# Altium footprint library my Library.PcbLib: 1247 footprints (part 73 of 78)
Each footprint in its own frame and in the unit in brackets; x right, y up, seen from the top. Pads: shape width x height; smd on the part's side, far side on the other; paste and mask are expansions set on the pad; w line width, h text height; cw(c..) or ccw(c..) is an arc to the next point about the centre after c.
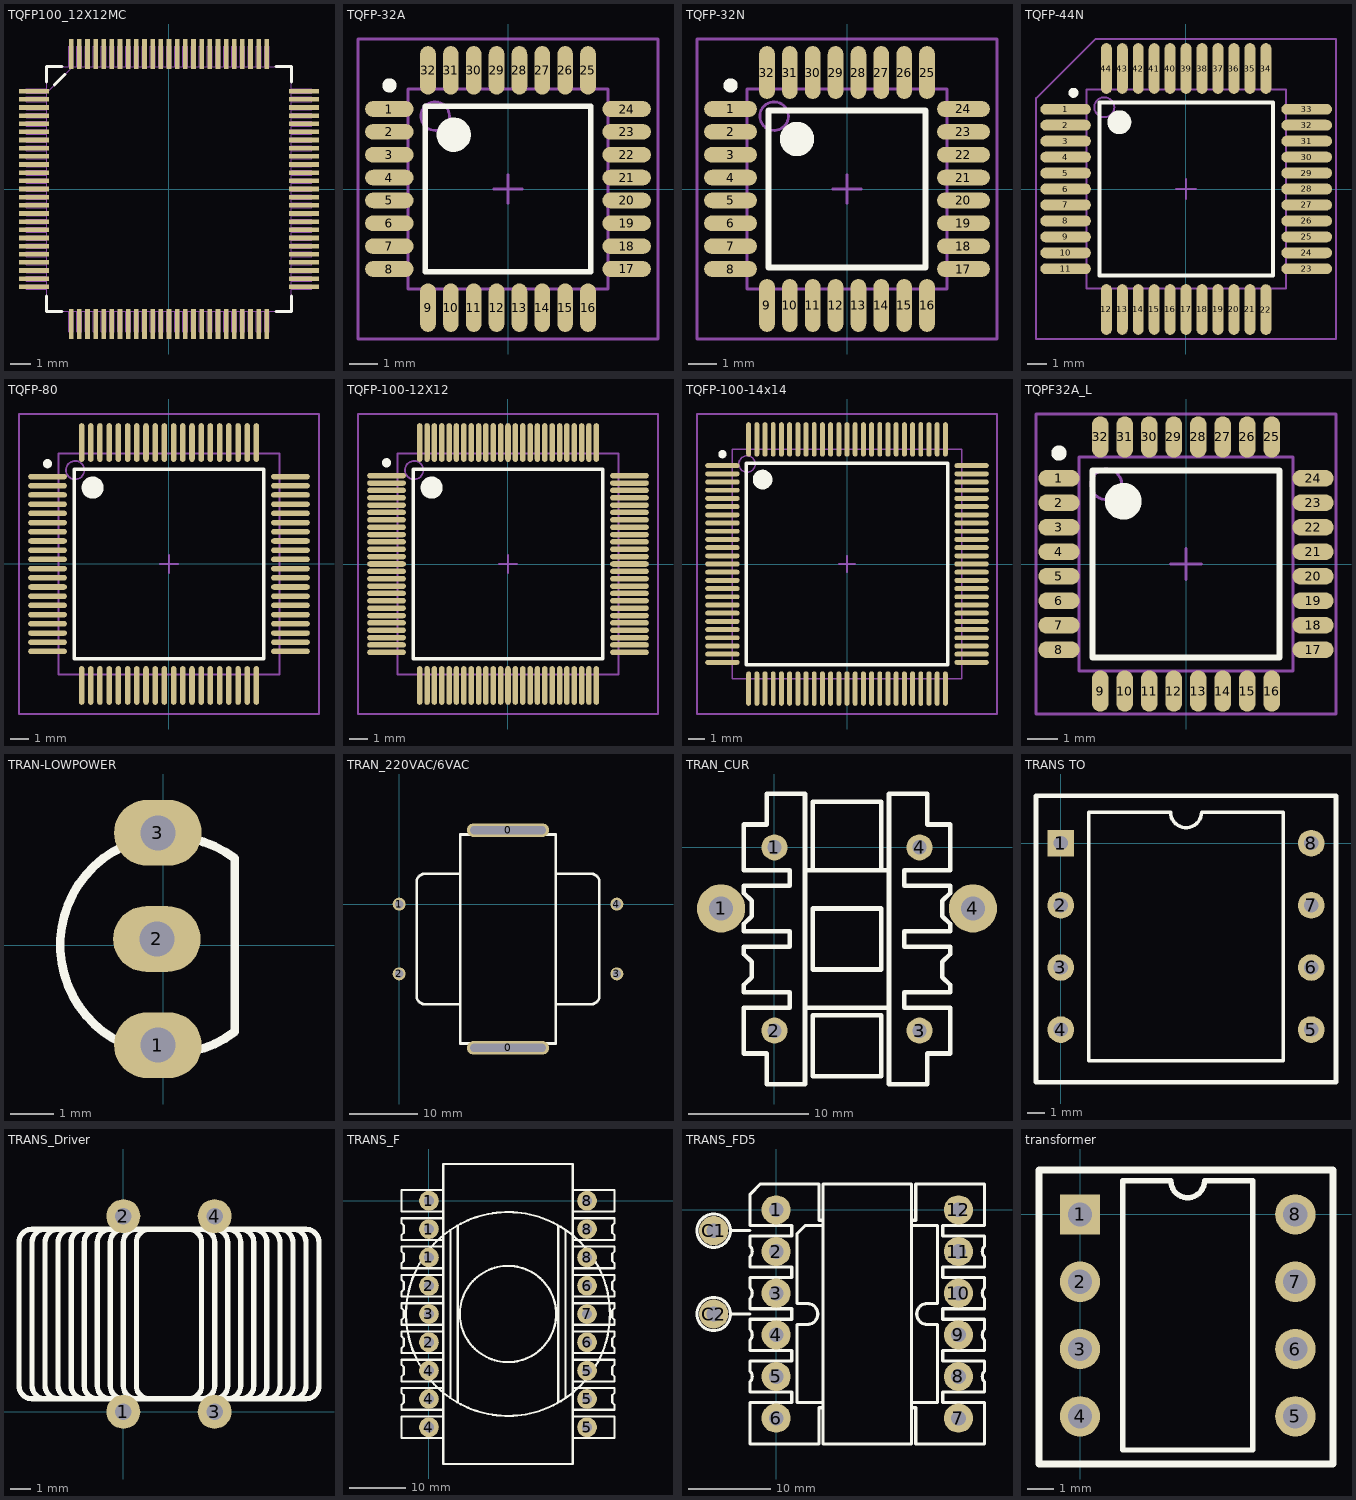
[diagram p72: the footprints below, top view; thin cyan lines are the x and y axes]

## TQFP100_12X12MC [mil]
pads (100):
  rect 58x9 smd: 1(-260.59,188.98) 2(-260.59,173.23) 3(-260.59,157.48) 4(-260.59,141.73) 5(-260.59,125.98) 6(-260.59,110.24) 7(-260.59,94.49) 8(-260.59,78.74) 9(-260.59,62.99) 10(-260.59,47.24) 11(-260.59,31.5) 12(-260.59,15.75) 13(-260.59,0) 14(-260.59,-15.75) 15(-260.59,-31.5) 16(-260.59,-47.24) 17(-260.59,-62.99) 18(-260.59,-78.74) 19(-260.59,-94.49) 20(-260.59,-110.24) 21(-260.59,-125.98) 22(-260.59,-141.73) 23(-260.59,-157.48) 24(-260.59,-173.23) 25(-260.59,-188.98) 51(260.59,-188.98) 52(260.59,-173.23) 53(260.59,-157.48) 54(260.59,-141.73) 55(260.59,-125.98) 56(260.59,-110.24) 57(260.59,-94.49) 58(260.59,-78.74) 59(260.59,-62.99) 60(260.59,-47.24) 61(260.59,-31.5) 62(260.59,-15.75) 63(260.59,0) 64(260.59,15.75) 65(260.59,31.5) 66(260.59,47.24) 67(260.59,62.99) 68(260.59,78.74) 69(260.59,94.49) 70(260.59,110.24) 71(260.59,125.98) 72(260.59,141.73) 73(260.59,157.48) 74(260.59,173.23) 75(260.59,188.98)
  rect 9x58 smd: 26(-188.98,-260.59) 27(-173.23,-260.59) 28(-157.48,-260.59) 29(-141.73,-260.59) 30(-125.98,-260.59) 31(-110.24,-260.59) 32(-94.49,-260.59) 33(-78.74,-260.59) 34(-62.99,-260.59) 35(-47.24,-260.59) 36(-31.5,-260.59) 37(-15.75,-260.59) 38(0,-260.59) 39(15.75,-260.59) 40(31.5,-260.59) 41(47.24,-260.59) 42(62.99,-260.59) 43(78.74,-260.59) 44(94.49,-260.59) 45(110.24,-260.59) 46(125.98,-260.59) 47(141.73,-260.59) 48(157.48,-260.59) 49(173.23,-260.59) 50(188.98,-260.59) 76(188.98,260.59) 77(173.23,260.59) 78(157.48,260.59) 79(141.73,260.59) 80(125.98,260.59) 81(110.24,260.59) 82(94.49,260.59) 83(78.74,260.59) 84(62.99,260.59) 85(47.24,260.59) 86(31.5,260.59) 87(15.75,260.59) 88(0,260.59) 89(-15.75,260.59) 90(-31.5,260.59) 91(-47.24,260.59) 92(-62.99,260.59) 93(-78.74,260.59) 94(-94.49,260.59) 95(-110.24,260.59) 96(-125.98,260.59) 97(-141.73,260.59) 98(-157.48,260.59) 99(-173.23,260.59) 100(-188.98,260.59)
Top Overlay:
  lines w6: -236.22,-206.58 -236.22,-236.22 -206.58,-236.22 ; -236.22,206.58 -236.22,236.22 -206.58,236.22 ; -221.11,201.33 -201.33,221.11 ; 206.58,-236.22 236.22,-236.22 236.22,-206.58 ; 206.58,236.22 236.22,236.22 236.22,206.58
Mechanical 1:
  drawing of 405 lines, arcs and shapes, not listed
3D body "User Library-TQFP100-10x10x05.step": height 39.97, standoff 0.6, extent -275.81,-278.81 275.37,272.37

## TQFP-32A [mm] "TQFP, 32-Leads, Body 9.3x9.3mm (max), Pitch 0.80mm, IPC Medium Density"
height 1.2
pads (32):
  oval 1.7x0.55 smd: 1(-4.15,2.8) 2(-4.15,2) 3(-4.15,1.2) 4(-4.15,0.4) 5(-4.15,-0.4) 6(-4.15,-1.2) 7(-4.15,-2) 8(-4.15,-2.8) 17(4.15,-2.8) 18(4.15,-2) 19(4.15,-1.2) 20(4.15,-0.4) 21(4.15,0.4) 22(4.15,1.2) 23(4.15,2) 24(4.15,2.8)
  oval 0.55x1.7 smd: 9(-2.8,-4.15) 10(-2,-4.15) 11(-1.2,-4.15) 12(-0.4,-4.15) 13(0.4,-4.15) 14(1.2,-4.15) 15(2,-4.15) 16(2.8,-4.15) 25(2.8,4.15) 26(2,4.15) 27(1.2,4.15) 28(0.4,4.15) 29(-0.4,4.15) 30(-1.2,4.15) 31(-2,4.15) 32(-2.8,4.15)
Top Overlay:
  circle w0.6: c-1.9,1.9 r0.3
  circle w0.25: c-4.15,3.625 r0.125
  lines w0.2: -2.9,-2.9 2.9,-2.9 2.9,2.9 -2.9,2.9 -2.9,-2.9
Mechanical 13:
  circle w0.1: c-2.55,2.55 r0.5
  lines w0.1: -3.5,-3.5 3.5,-3.5 3.5,3.5 -3.5,3.5 -3.5,-3.5
Mechanical 15:
  lines w0.1: -0.5,0 0.5,0 ; 0,-0.5 0,0.5 ; -5.25,-5.25 5.25,-5.25 5.25,5.25 -5.25,5.25 -5.25,-5.25
3D body "SW3dPS-SW3dPS-atmega8 (tqfp32)_V2008.STEP": height 1.02, standoff -0.09, extent -4.79,-4.807 4.81,4.793

## TQFP-32N [mm] "TQFP, 32-Leads, Body 9.2x9.2mm (max), Pitch 0.80mm, IPC Medium Density"
height 1.6
pads (32):
  oval 1.85x0.55 smd: 1(-4.075,2.8) 2(-4.075,2) 3(-4.075,1.2) 4(-4.075,0.4) 5(-4.075,-0.4) 6(-4.075,-1.2) 7(-4.075,-2) 8(-4.075,-2.8) 17(4.075,-2.8) 18(4.075,-2) 19(4.075,-1.2) 20(4.075,-0.4) 21(4.075,0.4) 22(4.075,1.2) 23(4.075,2) 24(4.075,2.8)
  oval 0.55x1.85 smd: 9(-2.8,-4.075) 10(-2,-4.075) 11(-1.2,-4.075) 12(-0.4,-4.075) 13(0.4,-4.075) 14(1.2,-4.075) 15(2,-4.075) 16(2.8,-4.075) 25(2.8,4.075) 26(2,4.075) 27(1.2,4.075) 28(0.4,4.075) 29(-0.4,4.075) 30(-1.2,4.075) 31(-2,4.075) 32(-2.8,4.075)
Top Overlay:
  circle w0.6: c-1.75,1.75 r0.3
  circle w0.25: c-4.075,3.625 r0.125
  lines w0.2: -2.75,-2.75 2.75,-2.75 2.75,2.75 -2.75,2.75 -2.75,-2.75
Mechanical 13:
  circle w0.1: c-2.55,2.55 r0.5
  lines w0.1: -3.5,-3.5 3.5,-3.5 3.5,3.5 -3.5,3.5 -3.5,-3.5
Mechanical 15:
  lines w0.1: -0.5,0 0.5,0 ; 0,-0.5 0,0.5 ; -5.25,-5.25 5.25,-5.25 5.25,5.25 -5.25,5.25 -5.25,-5.25
3D body: height 1.6, standoff 0.1, extent -3.5,-3.5 3.5,3.5

## TQFP-44N [mm]
pads (44):
  oval 2.54x0.55 smd: 1(-6.04,4.001) 2(-6.04,3.201) 3(-6.04,2.401) 4(-6.04,1.601) 5(-6.04,0.801) 6(-6.04,0.001) 7(-6.04,-0.799) 8(-6.04,-1.599) 9(-6.04,-2.399) 10(-6.04,-3.199) 11(-6.04,-3.999) 23(6.051,-3.998) 24(6.051,-3.198) 25(6.051,-2.398) 26(6.051,-1.598) 27(6.051,-0.798) 28(6.051,0.002) 29(6.051,0.802) 30(6.051,1.602) 31(6.051,2.402) 32(6.051,3.202) 33(6.05,4.002)
  oval 0.55x2.54 smd: 12(-3.995,-6.042) 13(-3.195,-6.042) 14(-2.395,-6.042) 15(-1.595,-6.042) 16(-0.795,-6.042) 17(0.005,-6.042) 18(0.805,-6.042) 19(1.605,-6.042) 20(2.405,-6.042) 21(3.205,-6.042) 22(4.006,-6.044) 34(4.005,6.045) 35(3.205,6.045) 36(2.405,6.045) 37(1.605,6.045) 38(0.805,6.045) 39(0.005,6.045) 40(-0.795,6.045) 41(-1.595,6.045) 42(-2.395,6.045) 43(-3.195,6.045) 44(-3.995,6.045)
Top Overlay:
  circle w0.6: c-3.345,3.352 r0.3
  circle w0.25: c-5.645,4.827 r0.125
  lines w0.2: -4.345,-4.348 -4.345,4.352 4.355,4.352 4.355,-4.348 -4.345,-4.348
Mechanical 13:
  circle w0.1: c-4.095,4.102 r0.5
  lines w0.1: -4.995,-4.998 5.005,-4.998 5.005,5.002 -4.995,5.002 -4.995,-4.998
Mechanical 15:
  lines w0.1: -7.523,-7.517 7.524,-7.517 7.524,7.52 -4.552,7.52 -7.513,4.558 -7.513,-7.517 ; -0.495,0.002 0.505,0.002 ; 0.005,-0.498 0.005,0.502
3D body "User Library-TQFP44.STEP": height 1.02, standoff -0.05, extent -6.011,-6.005 5.989,5.995

## TQFP-80 [mm] "Thin QFP, 80-Leads, Body 12x12mm, Pitch 0.5mm, IPC Low Density"
height 1.2
pads (80):
  oval 2.1x0.3 smd: 1(-6.6,4.75) 2(-6.6,4.25) 3(-6.6,3.75) 4(-6.6,3.25) 5(-6.6,2.75) 6(-6.6,2.25) 7(-6.6,1.75) 8(-6.6,1.25) 9(-6.6,0.75) 10(-6.6,0.25) 11(-6.6,-0.25) 12(-6.6,-0.75) 13(-6.6,-1.25) 14(-6.6,-1.75) 15(-6.6,-2.25) 16(-6.6,-2.75) 17(-6.6,-3.25) 18(-6.6,-3.75) 19(-6.6,-4.25) 20(-6.6,-4.75) 41(6.6,-4.75) 42(6.6,-4.25) 43(6.6,-3.75) 44(6.6,-3.25) 45(6.6,-2.75) 46(6.6,-2.25) 47(6.6,-1.75) 48(6.6,-1.25) 49(6.6,-0.75) 50(6.6,-0.25) 51(6.6,0.25) 52(6.6,0.75) 53(6.6,1.25) 54(6.6,1.75) 55(6.6,2.25) 56(6.6,2.75) 57(6.6,3.25) 58(6.6,3.75) 59(6.6,4.25) 60(6.6,4.75)
  oval 0.3x2.1 smd: 21(-4.75,-6.6) 22(-4.25,-6.6) 23(-3.75,-6.6) 24(-3.25,-6.6) 25(-2.75,-6.6) 26(-2.25,-6.6) 27(-1.75,-6.6) 28(-1.25,-6.6) 29(-0.75,-6.6) 30(-0.25,-6.6) 31(0.25,-6.6) 32(0.75,-6.6) 33(1.25,-6.6) 34(1.75,-6.6) 35(2.25,-6.6) 36(2.75,-6.6) 37(3.25,-6.6) 38(3.75,-6.6) 39(4.25,-6.6) 40(4.75,-6.6) 61(4.75,6.6) 62(4.25,6.6) 63(3.75,6.6) 64(3.25,6.6) 65(2.75,6.6) 66(2.25,6.6) 67(1.75,6.6) 68(1.25,6.6) 69(0.75,6.6) 70(0.25,6.6) 71(-0.25,6.6) 72(-0.75,6.6) 73(-1.25,6.6) 74(-1.75,6.6) 75(-2.25,6.6) 76(-2.75,6.6) 77(-3.25,6.6) 78(-3.75,6.6) 79(-4.25,6.6) 80(-4.75,6.6)
Top Overlay:
  circle w0.6: c-4.15,4.15 r0.3
  circle w0.25: c-6.6,5.45 r0.125
  lines w0.2: -5.15,-5.15 5.15,-5.15 5.15,5.15 -5.15,5.15 -5.15,-5.15
Mechanical 13:
  circle w0.1: c-5.1,5.1 r0.5
  lines w0.1: -6,-6 6,-6 6,6 -6,6 -6,-6
Mechanical 15:
  lines w0.1: -0.5,0 0.5,0 ; 0,-0.5 0,0.5 ; -8.15,-8.15 8.15,-8.15 8.15,8.15 -8.15,8.15 -8.15,-8.15
3D body: height 1.2, standoff 0, extent -6,-6 6,6

## TQFP-100-12X12 [mm] "Shrink QFP, 100-Leads, Body 12x12mm, Pitch 0.4mm, IPC High Density"
height 2.2
pads (100):
  oval 2.1x0.3 smd: 1(-6.6,4.8) 2(-6.6,4.4) 3(-6.6,4) 4(-6.6,3.6) 5(-6.6,3.2) 6(-6.6,2.8) 7(-6.6,2.4) 8(-6.6,2) 9(-6.6,1.6) 10(-6.6,1.2) 11(-6.6,0.8) 12(-6.6,0.4) 13(-6.6,0) 14(-6.6,-0.4) 15(-6.6,-0.8) 16(-6.6,-1.2) 17(-6.6,-1.6) 18(-6.6,-2) 19(-6.6,-2.4) 20(-6.6,-2.8) 21(-6.6,-3.2) 22(-6.6,-3.6) 23(-6.6,-4) 24(-6.6,-4.4) 25(-6.6,-4.8) 51(6.6,-4.8) 52(6.6,-4.4) 53(6.6,-4) 54(6.6,-3.6) 55(6.6,-3.2) 56(6.6,-2.8) 57(6.6,-2.4) 58(6.6,-2) 59(6.6,-1.6) 60(6.6,-1.2) 61(6.6,-0.8) 62(6.6,-0.4) 63(6.6,0) 64(6.6,0.4) 65(6.6,0.8) 66(6.6,1.2) 67(6.6,1.6) 68(6.6,2) 69(6.6,2.4) 70(6.6,2.8) 71(6.6,3.2) 72(6.6,3.6) 73(6.6,4) 74(6.6,4.4) 75(6.6,4.8)
  oval 0.3x2.1 smd: 26(-4.8,-6.6) 27(-4.4,-6.6) 28(-4,-6.6) 29(-3.6,-6.6) 30(-3.2,-6.6) 31(-2.8,-6.6) 32(-2.4,-6.6) 33(-2,-6.6) 34(-1.6,-6.6) 35(-1.2,-6.6) 36(-0.8,-6.6) 37(-0.4,-6.6) 38(0,-6.6) 39(0.4,-6.6) 40(0.8,-6.6) 41(1.2,-6.6) 42(1.6,-6.6) 43(2,-6.6) 44(2.4,-6.6) 45(2.8,-6.6) 46(3.2,-6.6) 47(3.6,-6.6) 48(4,-6.6) 49(4.4,-6.6) 50(4.8,-6.6) 76(4.8,6.6) 77(4.4,6.6) 78(4,6.6) 79(3.6,6.6) 80(3.2,6.6) 81(2.8,6.6) 82(2.4,6.6) 83(2,6.6) 84(1.6,6.6) 85(1.2,6.6) 86(0.8,6.6) 87(0.4,6.6) 88(0,6.6) 89(-0.4,6.6) 90(-0.8,6.6) 91(-1.2,6.6) 92(-1.6,6.6) 93(-2,6.6) 94(-2.4,6.6) 95(-2.8,6.6) 96(-3.2,6.6) 97(-3.6,6.6) 98(-4,6.6) 99(-4.4,6.6) 100(-4.8,6.6)
Top Overlay:
  circle w0.6: c-4.15,4.15 r0.3
  circle w0.25: c-6.6,5.5 r0.125
  lines w0.2: -5.15,-5.15 5.15,-5.15 5.15,5.15 -5.15,5.15 -5.15,-5.15
Mechanical 13:
  circle w0.1: c-5.1,5.1 r0.5
  lines w0.1: -6,-6 6,-6 6,6 -6,6 -6,-6
Mechanical 15:
  lines w0.1: -0.5,0 0.5,0 ; 0,-0.5 0,0.5 ; -8.15,-8.15 8.15,-8.15 8.15,8.15 -8.15,8.15 -8.15,-8.15
3D body: height 2.2, standoff 0, extent -6,-6 6,6

## TQFP-100-14x14 [mm] "Thin QFP, 100-Leads, Body 14x14mm, Pitch 0.5mm, IPC Low Density"
height 1.6
pads (100):
  oval 2.1x0.3 smd: 1(-7.6,6) 2(-7.6,5.5) 3(-7.6,5) 4(-7.6,4.5) 5(-7.6,4) 6(-7.6,3.5) 7(-7.6,3) 8(-7.6,2.5) 9(-7.6,2) 10(-7.6,1.5) 11(-7.6,1) 12(-7.6,0.5) 13(-7.6,0) 14(-7.6,-0.5) 15(-7.6,-1) 16(-7.6,-1.5) 17(-7.6,-2) 18(-7.6,-2.5) 19(-7.6,-3) 20(-7.6,-3.5) 21(-7.6,-4) 22(-7.6,-4.5) 23(-7.6,-5) 24(-7.6,-5.5) 25(-7.6,-6) 51(7.6,-6) 52(7.6,-5.5) 53(7.6,-5) 54(7.6,-4.5) 55(7.6,-4) 56(7.6,-3.5) 57(7.6,-3) 58(7.6,-2.5) 59(7.6,-2) 60(7.6,-1.5) 61(7.6,-1) 62(7.6,-0.5) 63(7.6,0) 64(7.6,0.5) 65(7.6,1) 66(7.6,1.5) 67(7.6,2) 68(7.6,2.5) 69(7.6,3) 70(7.6,3.5) 71(7.6,4) 72(7.6,4.5) 73(7.6,5) 74(7.6,5.5) 75(7.6,6)
  oval 0.3x2.1 smd: 26(-6,-7.6) 27(-5.5,-7.6) 28(-5,-7.6) 29(-4.5,-7.6) 30(-4,-7.6) 31(-3.5,-7.6) 32(-3,-7.6) 33(-2.5,-7.6) 34(-2,-7.6) 35(-1.5,-7.6) 36(-1,-7.6) 37(-0.5,-7.6) 38(0,-7.6) 39(0.5,-7.6) 40(1,-7.6) 41(1.5,-7.6) 42(2,-7.6) 43(2.5,-7.6) 44(3,-7.6) 45(3.5,-7.6) 46(4,-7.6) 47(4.5,-7.6) 48(5,-7.6) 49(5.5,-7.6) 50(6,-7.6) 76(6,7.6) 77(5.5,7.6) 78(5,7.6) 79(4.5,7.6) 80(4,7.6) 81(3.5,7.6) 82(3,7.6) 83(2.5,7.6) 84(2,7.6) 85(1.5,7.6) 86(1,7.6) 87(0.5,7.6) 88(0,7.6) 89(-0.5,7.6) 90(-1,7.6) 91(-1.5,7.6) 92(-2,7.6) 93(-2.5,7.6) 94(-3,7.6) 95(-3.5,7.6) 96(-4,7.6) 97(-4.5,7.6) 98(-5,7.6) 99(-5.5,7.6) 100(-6,7.6)
Top Overlay:
  circle w0.25: c-7.6,6.7 r0.125
  circle w0.6: c-5.15,5.15 r0.3
  lines w0.2: -6.15,-6.15 -6.15,6.15 6.15,6.15 6.15,-6.15 -6.15,-6.15
Mechanical 13:
  circle w0.1: c-6.1,6.1 r0.5
  lines w0.1: -7,-7 -7,7 7,7 7,-7 -7,-7
Mechanical 15:
  lines w0.1: -0.5,0 0.5,0 ; 0,-0.5 0,0.5 ; -9.15,-9.15 -9.15,9.15 9.15,9.15 9.15,-9.15 -9.15,-9.15
3D body: height 1.6, standoff 0, extent -7,-7 7,7

## TQPF32A_L [mm]
pads (32):
  oval 1.35x0.55 smd: 1(-4.15,2.8) 2(-4.15,2) 3(-4.15,1.2) 4(-4.15,0.4) 5(-4.15,-0.4) 6(-4.15,-1.2) 7(-4.15,-2) 8(-4.15,-2.8) 17(4.15,-2.8) 18(4.15,-2) 19(4.15,-1.2) 20(4.15,-0.4) 21(4.15,0.4) 22(4.15,1.2) 23(4.15,2) 24(4.15,2.8)
  oval 0.55x1.35 smd: 9(-2.8,-4.15) 10(-2,-4.15) 11(-1.2,-4.15) 12(-0.4,-4.15) 13(0.4,-4.15) 14(1.2,-4.15) 15(2,-4.15) 16(2.8,-4.15) 25(2.8,4.15) 26(2,4.15) 27(1.2,4.15) 28(0.4,4.15) 29(-0.4,4.15) 30(-1.2,4.15) 31(-2,4.15) 32(-2.8,4.15)
Top Overlay:
  circle w0.25: c-4.15,3.625 r0.125
  circle w0.6: c-2.05,2.05 r0.3
  lines w0.2: -3.05,-3.05 -3.05,3.05 3.05,3.05 3.05,-3.05 -3.05,-3.05
Mechanical 13:
  circle w0.1: c-2.6,2.6 r0.5
  lines w0.1: -3.5,-3.5 -3.5,3.5 3.5,3.5 3.5,-3.5 -3.5,-3.5
Mechanical 15:
  lines w0.1: -0.5,0 0.5,0 ; 0,-0.5 0,0.5 ; -4.9,-4.9 -4.9,4.9 4.9,4.9 4.9,-4.9 -4.9,-4.9
3D body "User Library-TQFP32-1.STEP": height 1.1, standoff 0, extent -4.509,-4.509 4.509,4.509

## TRAN-LOWPOWER [mm] "TO, Flat Index; 3 In-Line, Axial Leads; Body Dia. 4.5mm; Leads 0.51 x 0.48 mm (max)"
height 6.86
pads (3):
  oval 2x1.5 hole 0.8: 1(-0.127,-2.286) 2(-0.151,0.139) 3(-0.127,2.564)
Top Overlay:
  lines w0.2: 1.627,-1.98 cw(c0.127,0) 1.627,1.98 1.627,-1.98
3D body "BJT.step": height 11, standoff -1, extent -2.476,-2.794 1.524,3.006

## TRAN_220VAC/6VAC [mm]
pads (6):
  oval 12x2 hole 1.2 slot 11 at 0 deg: 0(15.875,-20.955) 0(15.875,10.795)
  round 1.905 hole 1.2: 1(0,0) 2(0,-10.16) 3(31.75,-10.16) 4(31.75,0)
Top Overlay:
  lines w0.381: 8.89,-14.605 3.81,-14.605 cw(c3.81,-13.335) 2.54,-13.335 2.54,3.175 cw(c3.81,3.175) 3.81,4.445 8.89,4.445 ; 22.86,-14.605 27.94,-14.605 ccw(c27.94,-13.335) 29.21,-13.335 29.21,3.175 ccw(c27.94,3.175) 27.94,4.445 22.86,4.445 ; 8.89,-20.32 8.89,10.16 22.86,10.16 22.86,-20.32 8.89,-20.32

## TRAN_CUR [mm]
pads (6):
  round 4 hole 2: 1(-4.445,-5.08) 4(16.51,-5.08)
  round 2.159 hole 1.2: 1(0,0) 2(0,-15.24) 3(12.065,-15.24) 4(12.065,0)
Top Overlay:
  lines w0.381: 2.54,-13.335 9.525,-13.335 ; 2.54,-1.905 9.525,-1.905 ; 3.175,-1.905 3.175,3.81 8.89,3.81 8.89,-1.905 ; -2.54,-17.145 -0.635,-17.145 -0.635,-19.685 2.54,-19.685 2.54,4.445 -0.635,4.445 -0.635,1.905 -2.54,1.905 -2.54,-1.905 1.27,-1.905 1.27,-3.175 -2.54,-3.175 -2.54,-3.81 -1.905,-4.445 -1.905,-5.715 -2.54,-6.35 -2.54,-6.985 1.27,-6.985 1.27,-8.255 -2.54,-8.255 -2.54,-8.89 -1.905,-9.525 -1.905,-10.795 -2.54,-11.43 -2.54,-12.065 1.27,-12.065 1.27,-13.335 -2.54,-13.335 -2.54,-17.145 ; 3.175,-19.05 3.175,-13.97 8.89,-13.97 8.89,-19.05 3.175,-19.05 ; 3.175,-10.16 3.175,-5.08 8.89,-5.08 8.89,-10.16 3.175,-10.16 ; 9.525,-19.685 9.525,4.445 12.7,4.445 12.7,1.905 14.605,1.905 14.605,-1.905 10.795,-1.905 10.795,-3.175 14.605,-3.175 14.605,-3.81 13.97,-4.445 13.97,-5.715 14.605,-6.35 14.605,-6.985 10.795,-6.985 10.795,-8.255 14.605,-8.255 14.605,-8.89 13.97,-9.525 13.97,-10.795 14.605,-11.43 14.605,-12.065 10.795,-12.065 10.795,-13.335 14.605,-13.335 14.605,-17.145 12.7,-17.145 12.7,-19.685 9.525,-19.685

## TRANS TO [mm]
pads (8):
  rect 1.5x1.5 hole 0.8: 1(0,0)
  round 1.5 hole 0.8: 2(0,-3.5) 3(0,-7) 4(0,-10.5) 5(14.1,-10.5) 6(14.1,-7) 7(14.1,-3.5) 8(14.1,0)
Top Overlay:
  lines w0.2: 1.585,-12.25 12.515,-12.25 12.515,1.75 7.925,1.75 cw(c7.05,1.75) 6.175,1.75 1.585,1.75 1.585,-12.25
  lines w0.254: -1.397,-13.462 -1.397,2.667 15.494,2.667 15.494,-13.462 15.367,-13.462 -1.397,-13.462
3D body "bien ap.step": height 4.69, standoff -11.87, extent 0.889,-11.944 13.289,1.276

## TRANS_Driver [mil]
pads (4):
  round 65 hole 31.5: 1(0,0) 2(0,375) 3(175,0) 4(175,375)
Top Overlay:
  lines w10: -150,25 cw(c-150,50) -175,50 -175,325 cw(c-150,325) -150,350 ; -125,25 cw(c-125,50) -150,50 -150,325 cw(c-125,325) -125,350 ; -100,25 cw(c-100,50) -125,50 -125,325 cw(c-100,325) -100,350 ; -75,25 cw(c-75,50) -100,50 -100,325 cw(c-75,325) -75,350 ; -50,25 cw(c-50,50) -75,50 -75,325 cw(c-50,325) -50,350 ; -25,25 cw(c-25,50) -50,50 -50,325 cw(c-25,325) -25,350 ; 0,25 cw(c0,50) -25,50 -25,325 cw(c0,325) 0,350 ; 25,25 cw(c25,50) 0,50 0,325 cw(c25,325) 25,350 ; 50,25 cw(c50,50) 25,50 25,325 cw(c50,325) 50,350 ; 125,25 ccw(c125,50) 150,50 150,325 ccw(c125,325) 125,350 ; 150,25 ccw(c150,50) 175,50 175,325 ccw(c150,325) 150,350 ; 175,25 ccw(c175,50) 200,50 200,325 ccw(c175,325) 175,350 ; 200,25 ccw(c200,50) 225,50 225,325 ccw(c200,325) 200,350 ; 225,25 ccw(c225,50) 250,50 250,325 ccw(c225,325) 225,350 ; 250,25 ccw(c250,50) 275,50 275,325 ccw(c250,325) 250,350 ; 275,25 ccw(c275,50) 300,50 300,325 ccw(c275,325) 275,350 ; 300,25 ccw(c300,50) 325,50 325,325 ccw(c300,325) 300,350 ; 325,25 ccw(c325,50) 350,50 350,325 ccw(c325,325) 325,350 ; -200,50 ccw(c-175,50) -175,25 350,25 ccw(c350,50) 375,50 375,325 ccw(c350,325) 350,350 -175,350 ccw(c-175,325) -200,325 -200,50

## TRANS_F [mm]
pads (18):
  round 3.5 hole 1.8: 1(0,-10) 1(0,-5) 1(0,0) 2(0,-25) 2(0,-15) 3(0,-20) 4(0,-40) 4(0,-35) 4(0,-30) 5(27.94,-40) 5(27.94,-35) 5(27.94,-30) 6(27.94,-25) 6(27.94,-15) 7(27.94,-20) 8(27.94,-10) 8(27.94,-5) 8(27.94,0)
Top Overlay:
  circle w0.381: c13.97,-20 r8.5
  circle w0.381: c13.97,-20 r18
  lines w0.381: 2.286,-41.905 -4.826,-41.905 -4.826,-38.095 2.286,-38.095 ; 2.286,-36.905 -4.826,-36.905 -4.826,-36.016 -4.445,-35.635 -4.445,-34.365 -4.826,-33.984 -4.826,-33.73 -4.826,-33.095 2.286,-33.095 ; 2.286,-31.905 -4.826,-31.905 -4.826,-31.016 -4.445,-30.635 -4.445,-29.365 -4.826,-28.984 -4.826,-28.73 -4.826,-28.095 2.286,-28.095 ; 2.286,-26.905 -4.826,-26.905 -4.826,-26.016 -4.445,-25.635 -4.445,-24.365 -4.826,-23.984 -4.826,-23.73 -4.826,-23.095 2.286,-23.095 ; 2.286,-21.905 -4.826,-21.905 -4.826,-21.016 -4.445,-20.635 -4.445,-19.365 -4.826,-18.984 -4.826,-18.73 -4.826,-18.095 2.286,-18.095 ; 2.286,-16.905 -4.826,-16.905 -4.826,-16.016 -4.445,-15.635 -4.445,-14.365 -4.826,-13.984 -4.826,-13.73 -4.826,-13.095 2.286,-13.095 ; 2.286,-11.905 -4.826,-11.905 -4.826,-11.016 -4.445,-10.635 -4.445,-9.365 -4.826,-8.984 -4.826,-8.73 -4.826,-8.095 2.286,-8.095 ; 2.286,-6.905 -4.826,-6.905 -4.826,-6.016 -4.445,-5.635 -4.445,-4.365 -4.826,-3.984 -4.826,-3.73 -4.826,-3.095 2.286,-3.095 ; 2.286,-1.905 -4.826,-1.905 -4.826,1.905 2.286,1.905 ; 3.81,-34.798 3.81,-5.232 ; 5.08,-35.56 5.08,-4.42 ; 22.86,-35.611 22.86,-4.42 ; 24.13,-34.747 24.13,-5.283 ; 25.654,-41.905 32.766,-41.905 32.766,-38.095 25.654,-38.095 ; 25.654,-36.905 32.766,-36.905 32.766,-36.016 32.385,-35.635 32.385,-34.365 32.766,-33.984 32.766,-33.73 32.766,-33.095 25.654,-33.095 ; 25.654,-31.905 32.766,-31.905 32.766,-31.016 32.385,-30.635 32.385,-29.365 32.766,-28.984 32.766,-28.73 32.766,-28.095 25.654,-28.095 ; 25.654,-26.905 32.766,-26.905 32.766,-26.016 32.385,-25.635 32.385,-24.365 32.766,-23.984 32.766,-23.73 32.766,-23.095 25.654,-23.095 ; 25.654,-21.905 32.766,-21.905 32.766,-21.016 32.385,-20.635 32.385,-19.365 32.766,-18.984 32.766,-18.73 32.766,-18.095 25.654,-18.095 ; 25.654,-16.905 32.766,-16.905 32.766,-16.016 32.385,-15.635 32.385,-14.365 32.766,-13.984 32.766,-13.73 32.766,-13.095 25.654,-13.095 ; 25.654,-11.905 32.766,-11.905 32.766,-11.016 32.385,-10.635 32.385,-9.365 32.766,-8.984 32.766,-8.73 32.766,-8.095 25.654,-8.095 ; 25.654,-6.905 32.766,-6.905 32.766,-6.016 32.385,-5.635 32.385,-4.365 32.766,-3.984 32.766,-3.73 32.766,-3.095 25.654,-3.095 ; 25.654,-1.905 32.766,-1.905 32.766,1.905 25.654,1.905 ; 2.54,-46.5 25.4,-46.5 25.4,6.5 2.54,6.5 2.54,-46.5

## TRANS_FD5 [mil]
pads (14):
  round 140 hole 70.87: 1(0,0) 2(0,-200) 3(0,-400) 4(0,-600) 5(0,-800) 6(0,-1000) 7(875,-1000) 8(875,-800) 9(875,-600) 10(875,-400) 11(875,-200) 12(875,0) C1(-300,-100) C2(-300,-500)
Top Overlay:
  circle w15: c-300,-100 r80
  circle w15: c-300,-500 r80
  lines w15: -220,-500 -125,-500 ; -220,-100 -125,-100 ; 225,-950 205,-950 205,-1125 -125,-1125 -125,-975 -125,-925 75,-925 75,-875 -125,-875 -125,-825 ccw(c-150,-800) -125,-775 -125,-725 75,-725 75,-675 -125,-675 -125,-625 ccw(c-150,-600) -125,-575 -125,-525 75,-525 75,-475 -125,-475 -125,-425 ccw(c-150,-400) -125,-375 -125,-325 75,-325 75,-275 -125,-275 -125,-225 ccw(c-150,-200) -125,-175 -125,-125 75,-125 75,-75 -125,-75 -125,75 -75,125 5,125 205,125 205,-50 225,-50 ; 225,-925 100,-925 100,-550 150,-550 ccw(c150,-500) 150,-450 100,-450 100,-115 140,-75 225,-75 ; 650,-950 670,-950 670,-1125 1000,-1125 1000,-975 1000,-925 800,-925 800,-875 1000,-875 1000,-825 cw(c1025,-800) 1000,-775 1000,-725 800,-725 800,-675 1000,-675 1000,-625 cw(c1025,-600) 1000,-575 1000,-525 800,-525 800,-475 1000,-475 1000,-425 cw(c1025,-400) 1000,-375 1000,-325 800,-325 800,-275 1000,-275 1000,-225 cw(c1025,-200) 1000,-175 1000,-125 800,-125 800,-75 1000,-75 1000,125 870,125 670,125 670,-50 650,-50 ; 650,-925 775,-925 775,-550 725,-550 cw(c725,-500) 725,-450 775,-450 775,-75 650,-75 ; 225,-1125 650,-1125 650,125 225,125 225,-1125

## transformer [mm]
pads (8):
  rect 1.5x1.5 hole 0.9: 1(0,0)
  round 1.5 hole 0.9: 2(0,-2.5) 3(0,-5) 4(0,-7.5) 5(8,-7.5) 6(8,-5) 7(8,-2.5) 8(8,0)
Top Overlay:
  lines w0.2: 1.585,-8.75 6.415,-8.75 6.415,1.25 4.625,1.25 cw(c4,1.25) 3.375,1.25 1.585,1.25 1.585,-8.75
  lines w0.254: -1.524,-9.271 -1.524,1.651 9.398,1.651 9.398,-9.271 -1.524,-9.271
3D body "bien ap.step": height 11.88, standoff -4.67, extent -2.136,-10.547 10.264,2.673